# Altium footprint library pw.PcbLib: 210 footprints (part 1 of 14)
Each footprint in its own frame and in the unit in brackets; x right, y up, seen from the top. Pads: shape width x height; smd on the part's side, far side on the other; paste and mask are expansions set on the pad; w line width, h text height; cw(c..) or ccw(c..) is an arc to the next point about the centre after c.
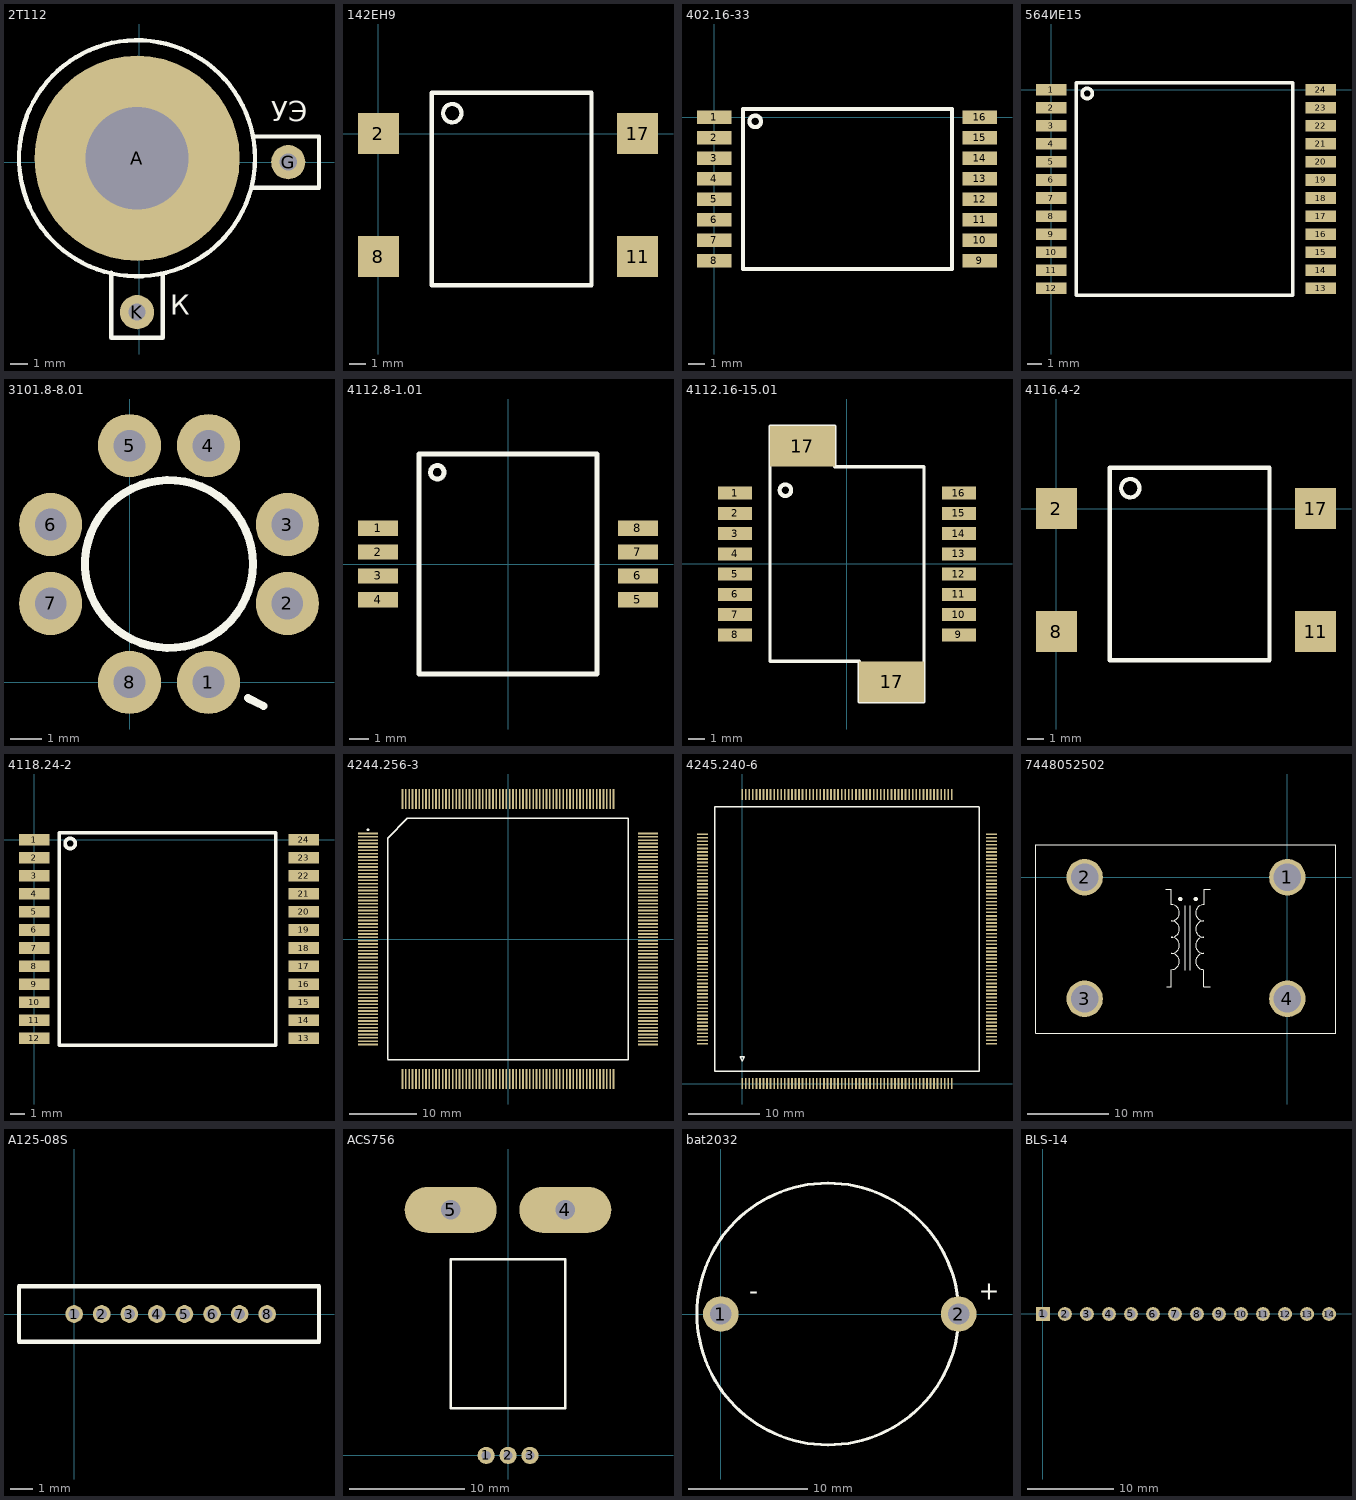
[diagram p0: the footprints below, top view; thin cyan lines are the x and y axes]

## 2T112 [mm]
pads (3):
  round 12 hole 6: A(-0.14,0.23)
  round 2 hole 1: G(8.7,0) K(-0.14,-8.77)
Top Overlay:
  circle w0.254: c-0.14,0.23 r6.9
  lines w0.254: -1.64,-6.47 -1.64,-10.27 ; 1.36,-6.57 1.36,-10.27 ; 6.7,-1.5 10.5,-1.5 10.5,1.5 6.8,1.5 ; -1.64,-10.27 1.36,-10.27 ; -1.64,-10.27 1.36,-10.27
  text "К" at 1.8,-9.3 h2
  text "УЭ" at 7.7,2 h2
3D body "User Library-DO-203AA_DO-4.STEP": height 20.3, standoff -11.5, extent -5.64,-6.028 5.36,6.488

## 142ЕН9 [mm]
pads (4):
  rect 2.5x2.5 smd: 2(0,0) 8(0,-7.5) 11(15.8,-7.5) 17(15.8,0)
Top Overlay:
  circle w0.254: c4.5,1.25 r0.559
  lines w0.254: 3.25,-9.25 3.25,2.5 13,2.5 13,-9.25 3.25,-9.25

## 402.16-33 [mm]
pads (16):
  rect 2.1x0.8 smd: 1(0,0) 2(0,-1.25) 3(0,-2.5) 4(0,-3.75) 5(0,-5) 6(0,-6.25) 7(0,-7.5) 8(0,-8.75) 9(16.2,-8.75) 10(16.2,-7.5) 11(16.2,-6.25) 12(16.2,-5) 13(16.2,-3.75) 14(16.2,-2.5) 15(16.2,-1.25) 16(16.2,0)
Top Overlay:
  circle w0.254: c2.5,-0.25 r0.354
  lines w0.254: 1.75,-9.25 14.5,-9.25 14.5,0.5 1.75,0.5 1.75,-9.25
3D body "User Library-402_16.STEP": height 2.51, standoff 0, extent 0.75,-10 15.25,1.5

## 564ИЕ15 [mm]
pads (24):
  rect 2.1x0.8 smd: 1(0,0) 2(0,-1.25) 3(0,-2.5) 4(0,-3.75) 5(0,-5) 6(0,-6.25) 7(0,-7.5) 8(0,-8.75) 9(0,-10) 10(0,-11.25) 11(0,-12.5) 12(0,-13.75) 13(18.7,-13.75) 14(18.7,-12.5) 15(18.7,-11.25) 16(18.7,-10) 17(18.7,-8.75) 18(18.7,-7.5) 19(18.7,-6.25) 20(18.7,-5) 21(18.7,-3.75) 22(18.7,-2.5) 23(18.7,-1.25) 24(18.7,0)
Top Overlay:
  circle w0.254: c2.5,-0.25 r0.354
  lines w0.254: 1.75,-14.25 1.75,0.5 16.75,0.5 16.75,-14.25 1.75,-14.25

## 3101.8-8.01 [mm] "544УД1, 521СА301"
pads (8):
  round 2 hole 1: 1(2.5,0) 2(5,2.5) 3(5,5) 4(2.5,7.5) 5(0,7.5) 6(-2.5,5) 7(-2.5,2.5) 8(0,0)
Top Overlay:
  circle w0.254: c1.25,3.75 r2.658
  lines w0.254: 3.75,-0.5 4.25,-0.75

## 4112.8-1.01 [mm]
height 2.5
pads (8):
  rect 2.1x0.8 smd: 1(-6.8,1.875) 2(-6.8,0.625) 3(-6.8,-0.625) 4(-6.8,-1.875) 5(6.8,-1.875) 6(6.8,-0.625) 7(6.8,0.625) 8(6.8,1.875)
Top Overlay:
  circle w0.254: c-3.7,4.8 r0.354
  lines w0.254: -4.65,-5.75 4.65,-5.75 4.65,-2.875 4.65,2.875 4.65,5.75 -4.65,5.75 -4.65,-5.75
3D body "User Library-4112_8-1_01.step": height 2.5, standoff 0, extent -7.15,-5.75 7.15,5.75

## 4112.16-15.01 [mm]
height 2.5
pads (18):
  rect 2.1x0.8 smd: 1(-6.9,4.375) 2(-6.9,3.125) 3(-6.9,1.875) 4(-6.9,0.625) 5(-6.9,-0.625) 6(-6.9,-1.875) 7(-6.9,-3.125) 8(-6.9,-4.375) 9(6.9,-4.375) 10(6.9,-3.125) 11(6.9,-1.875) 12(6.9,-0.625) 13(6.9,0.625) 14(6.9,1.875) 15(6.9,3.125) 16(6.9,4.375)
  rect 4x2.5 smd: 17(-2.75,7.25) 17(2.75,-7.25)
Top Overlay:
  circle w0.254: c-3.8,4.55 r0.354
  lines w0.2: -3.25,8.5 -4.75,8.5 ; 4.5,-8.5 4.75,-8.5 ; -4.75,8.5 -0.75,8.5 -0.75,6 4.75,6 4.75,-8.5 ; -4.75,8.5 -4.75,-6 0.75,-6 0.75,-8.5 4.75,-8.5
3D body "User Library-402_16.STEP": height 2.51, standoff 0, extent -7.25,-5.75 7.25,5.75

## 4116.4-2 [mm] "142ЕН9"
pads (4):
  rect 2.5x2.5 smd: 2(0,0) 8(0,-7.5) 11(15.8,-7.5) 17(15.8,0)
Top Overlay:
  circle w0.254: c4.5,1.25 r0.559
  lines w0.254: 3.25,-9.25 3.25,2.5 13,2.5 13,-9.25 3.25,-9.25
3D body "User Library-4116_4-2.STEP": height 3.2, standoff 0, extent 1,-16.25 15,8.75

## 4118.24-2 [mm]
pads (24):
  rect 2.1x0.8 smd: 1(0,0) 2(0,-1.25) 3(0,-2.5) 4(0,-3.75) 5(0,-5) 6(0,-6.25) 7(0,-7.5) 8(0,-8.75) 9(0,-10) 10(0,-11.25) 11(0,-12.5) 12(0,-13.75) 13(18.7,-13.75) 14(18.7,-12.5) 15(18.7,-11.25) 16(18.7,-10) 17(18.7,-8.75) 18(18.7,-7.5) 19(18.7,-6.25) 20(18.7,-5) 21(18.7,-3.75) 22(18.7,-2.5) 23(18.7,-1.25) 24(18.7,0)
Top Overlay:
  circle w0.254: c2.5,-0.25 r0.354
  lines w0.254: 1.75,-14.25 16.75,-14.25 16.75,0.5 1.75,0.5 1.75,-14.25
3D body "User Library-4118_24-1-1.STEP": height 3.21, standoff 0, extent 0,-14.46 18.5,0.95

## 4244.256-3 [mm]
pads (256):
  rect 3x0.25 smd: 1(-20.898,15.75) 2(-20.898,15.25) 3(-20.898,14.75) 4(-20.898,14.25) 5(-20.898,13.75) 6(-20.898,13.25) 7(-20.898,12.75) 8(-20.898,12.25) 9(-20.898,11.75) 10(-20.898,11.25) 11(-20.898,10.75) 12(-20.898,10.25) 13(-20.898,9.75) 14(-20.898,9.25) 15(-20.898,8.75) 16(-20.898,8.25) 17(-20.898,7.75) 18(-20.898,7.25) 19(-20.898,6.75) 20(-20.898,6.25) 21(-20.898,5.75) 22(-20.898,5.25) 23(-20.898,4.75) 24(-20.898,4.25) 25(-20.898,3.75) 26(-20.898,3.25) 27(-20.898,2.75) 28(-20.898,2.25) 29(-20.898,1.75) 30(-20.898,1.25) 31(-20.898,0.75) 32(-20.898,0.25) 33(-20.898,-0.25) 34(-20.898,-0.75) 35(-20.898,-1.25) 36(-20.898,-1.75) 37(-20.898,-2.25) 38(-20.898,-2.75) 39(-20.898,-3.25) 40(-20.898,-3.75) 41(-20.898,-4.25) 42(-20.898,-4.75) 43(-20.898,-5.25) 44(-20.898,-5.75) 45(-20.898,-6.25) 46(-20.898,-6.75) 47(-20.898,-7.25) 48(-20.898,-7.75) 49(-20.898,-8.25) 50(-20.898,-8.75) 51(-20.898,-9.25) 52(-20.898,-9.75) 53(-20.898,-10.25) 54(-20.898,-10.75) 55(-20.898,-11.25) 56(-20.898,-11.75) 57(-20.898,-12.25) 58(-20.898,-12.75) 59(-20.898,-13.25) 60(-20.898,-13.75) 61(-20.898,-14.25) 62(-20.898,-14.75) 63(-20.898,-15.25) 64(-20.898,-15.75) 129(20.898,-15.75) 130(20.898,-15.25) 131(20.898,-14.75) 132(20.898,-14.25) 133(20.898,-13.75) 134(20.898,-13.25) 135(20.898,-12.75) 136(20.898,-12.25) 137(20.898,-11.75) 138(20.898,-11.25) 139(20.898,-10.75) 140(20.898,-10.25) 141(20.898,-9.75) 142(20.898,-9.25) 143(20.898,-8.75) 144(20.898,-8.25) 145(20.898,-7.75) 146(20.898,-7.25) 147(20.898,-6.75) 148(20.898,-6.25) 149(20.898,-5.75) 150(20.898,-5.25) 151(20.898,-4.75) 152(20.898,-4.25) 153(20.898,-3.75) 154(20.898,-3.25) 155(20.898,-2.75) 156(20.898,-2.25) 157(20.898,-1.75) 158(20.898,-1.25) 159(20.898,-0.75) 160(20.898,-0.25) 161(20.898,0.25) 162(20.898,0.75) 163(20.898,1.25) 164(20.898,1.75) 165(20.898,2.25) 166(20.898,2.75) 167(20.898,3.25) 168(20.898,3.75) 169(20.898,4.25) 170(20.898,4.75) 171(20.898,5.25) 172(20.898,5.75) 173(20.898,6.25) 174(20.898,6.75) 175(20.898,7.25) 176(20.898,7.75) 177(20.898,8.25) 178(20.898,8.75) 179(20.898,9.25) 180(20.898,9.75) 181(20.898,10.25) 182(20.898,10.75) 183(20.898,11.25) 184(20.898,11.75) 185(20.898,12.25) 186(20.898,12.75) 187(20.898,13.25) 188(20.898,13.75) 189(20.898,14.25) 190(20.898,14.75) 191(20.898,15.25) 192(20.898,15.75)
  rect 0.25x3 smd: 65(-15.75,-20.898) 66(-15.25,-20.898) 67(-14.75,-20.898) 68(-14.25,-20.898) 69(-13.75,-20.898) 70(-13.25,-20.898) 71(-12.75,-20.898) 72(-12.25,-20.898) 73(-11.75,-20.898) 74(-11.25,-20.898) 75(-10.75,-20.898) 76(-10.25,-20.898) 77(-9.75,-20.898) 78(-9.25,-20.898) 79(-8.75,-20.898) 80(-8.25,-20.898) 81(-7.75,-20.898) 82(-7.25,-20.898) 83(-6.75,-20.898) 84(-6.25,-20.898) 85(-5.75,-20.898) 86(-5.25,-20.898) 87(-4.75,-20.898) 88(-4.25,-20.898) 89(-3.75,-20.898) 90(-3.25,-20.898) 91(-2.75,-20.898) 92(-2.25,-20.898) 93(-1.75,-20.898) 94(-1.25,-20.898) 95(-0.75,-20.898) 96(-0.25,-20.898) 97(0.25,-20.898) 98(0.75,-20.898) 99(1.25,-20.898) 100(1.75,-20.898) 101(2.25,-20.898) 102(2.75,-20.898) 103(3.25,-20.898) 104(3.75,-20.898) 105(4.25,-20.898) 106(4.75,-20.898) 107(5.25,-20.898) 108(5.75,-20.898) 109(6.25,-20.898) 110(6.75,-20.898) 111(7.25,-20.898) 112(7.75,-20.898) 113(8.25,-20.898) 114(8.75,-20.898) 115(9.25,-20.898) 116(9.75,-20.898) 117(10.25,-20.898) 118(10.75,-20.898) 119(11.25,-20.898) 120(11.75,-20.898) 121(12.25,-20.898) 122(12.75,-20.898) 123(13.25,-20.898) 124(13.75,-20.898) 125(14.25,-20.898) 126(14.75,-20.898) 127(15.25,-20.898) 128(15.75,-20.898) 193(15.75,20.898) 194(15.25,20.898) 195(14.75,20.898) 196(14.25,20.898) 197(13.75,20.898) 198(13.25,20.898) 199(12.75,20.898) 200(12.25,20.898) 201(11.75,20.898) 202(11.25,20.898) 203(10.75,20.898) 204(10.25,20.898) 205(9.75,20.898) 206(9.25,20.898) 207(8.75,20.898) 208(8.25,20.898) 209(7.75,20.898) 210(7.25,20.898) 211(6.75,20.898) 212(6.25,20.898) 213(5.75,20.898) 214(5.25,20.898) 215(4.75,20.898) 216(4.25,20.898) 217(3.75,20.898) 218(3.25,20.898) 219(2.75,20.898) 220(2.25,20.898) 221(1.75,20.898) 222(1.25,20.898) 223(0.75,20.898) 224(0.25,20.898) 225(-0.25,20.898) 226(-0.75,20.898) 227(-1.25,20.898) 228(-1.75,20.898) 229(-2.25,20.898) 230(-2.75,20.898) 231(-3.25,20.898) 232(-3.75,20.898) 233(-4.25,20.898) 234(-4.75,20.898) 235(-5.25,20.898) 236(-5.75,20.898) 237(-6.25,20.898) 238(-6.75,20.898) 239(-7.25,20.898) 240(-7.75,20.898) 241(-8.25,20.898) 242(-8.75,20.898) 243(-9.25,20.898) 244(-9.75,20.898) 245(-10.25,20.898) 246(-10.75,20.898) 247(-11.25,20.898) 248(-11.75,20.898) 249(-12.25,20.898) 250(-12.75,20.898) 251(-13.25,20.898) 252(-13.75,20.898) 253(-14.25,20.898) 254(-14.75,20.898) 255(-15.25,20.898) 256(-15.75,20.898)
Top Overlay:
  circle w0.254: c-20.896,16.307 r0.077
  lines w0.2: -17.991,-18 -16.05,-18 ; -17.991,-17.964 -17.991,15.076 -15.067,18 -5.135,18 16.05,18 17.988,18 17.988,14.851 ; -17.988,-17.964 -17.988,-16.05 ; -16.264,-18 14.621,-18 17.988,-18 ; 17.988,-17.998 17.988,-16.05 ; 17.988,-16.61 17.991,14.851
3D body "User Library-4244_256-3.step": height 3.26, standoff 0, extent -21.415,-21.397 21.385,21.403

## 4245.240-6 [mm]
pads (240):
  rect 0.25x1.524 smd: 1(0,0) 2(0.5,0) 3(1,0) 4(1.5,0) 5(2,0) 6(2.5,0) 7(3,0) 8(3.5,0) 9(4,0) 10(4.5,0) 11(5,0) 12(5.5,0) 13(6,0) 14(6.5,0) 15(7,0) 16(7.5,0) 17(8,0) 18(8.5,0) 19(9,0) 20(9.5,0) 21(10,0) 22(10.5,0) 23(11,0) 24(11.5,0) 25(12,0) 26(12.5,0) 27(13,0) 28(13.5,0) 29(14,0) 30(14.5,0) 31(15,0) 32(15.5,0) 33(16,0) 34(16.5,0) 35(17,0) 36(17.5,0) 37(18,0) 38(18.5,0) 39(19,0) 40(19.5,0) 41(20,0) 42(20.5,0) 43(21,0) 44(21.5,0) 45(22,0) 46(22.5,0) 47(23,0) 48(23.5,0) 49(24,0) 50(24.5,0) 51(25,0) 52(25.5,0) 53(26,0) 54(26.5,0) 55(27,0) 56(27.5,0) 57(28,0) 58(28.5,0) 59(29,0) 60(29.5,0) 121(29.5,40.7) 122(29,40.7) 123(28.5,40.7) 124(28,40.7) 125(27.5,40.7) 126(27,40.7) 127(26.5,40.7) 128(26,40.7) 129(25.5,40.7) 130(25,40.7) 131(24.5,40.7) 132(24,40.7) 133(23.5,40.7) 134(23,40.7) 135(22.5,40.7) 136(22,40.7) 137(21.5,40.7) 138(21,40.7) 139(20.5,40.7) 140(20,40.7) 141(19.5,40.7) 142(19,40.7) 143(18.5,40.7) 144(18,40.7) 145(17.5,40.7) 146(17,40.7) 147(16.5,40.7) 148(16,40.7) 149(15.5,40.7) 150(15,40.7) 151(14.5,40.7) 152(14,40.7) 153(13.5,40.7) 154(13,40.7) 155(12.5,40.7) 156(12,40.7) 157(11.5,40.7) 158(11,40.7) 159(10.5,40.7) 160(10,40.7) 161(9.5,40.7) 162(9,40.7) 163(8.5,40.7) 164(8,40.7) 165(7.5,40.7) 166(7,40.7) 167(6.5,40.7) 168(6,40.7) 169(5.5,40.7) 170(5,40.7) 171(4.5,40.7) 172(4,40.7) 173(3.5,40.7) 174(3,40.7) 175(2.5,40.7) 176(2,40.7) 177(1.5,40.7) 178(1,40.7) 179(0.5,40.7) 180(0,40.7)
  rect 1.524x0.25 smd: 61(35.1,5.6) 62(35.1,6.1) 63(35.1,6.6) 64(35.1,7.1) 65(35.1,7.6) 66(35.1,8.1) 67(35.1,8.6) 68(35.1,9.1) 69(35.1,9.6) 70(35.1,10.1) 71(35.1,10.6) 72(35.1,11.1) 73(35.1,11.6) 74(35.1,12.1) 75(35.1,12.6) 76(35.1,13.1) 77(35.1,13.6) 78(35.1,14.1) 79(35.1,14.6) 80(35.1,15.1) 81(35.1,15.6) 82(35.1,16.1) 83(35.1,16.6) 84(35.1,17.1) 85(35.1,17.6) 86(35.1,18.1) 87(35.1,18.6) 88(35.1,19.1) 89(35.1,19.6) 90(35.1,20.1) 91(35.1,20.6) 92(35.1,21.1) 93(35.1,21.6) 94(35.1,22.1) 95(35.1,22.6) 96(35.1,23.1) 97(35.1,23.6) 98(35.1,24.1) 99(35.1,24.6) 100(35.1,25.1) 101(35.1,25.6) 102(35.1,26.1) 103(35.1,26.6) 104(35.1,27.1) 105(35.1,27.6) 106(35.1,28.1) 107(35.1,28.6) 108(35.1,29.1) 109(35.1,29.6) 110(35.1,30.1) 111(35.1,30.6) 112(35.1,31.1) 113(35.1,31.6) 114(35.1,32.1) 115(35.1,32.6) 116(35.1,33.1) 117(35.1,33.6) 118(35.1,34.1) 119(35.1,34.6) 120(35.1,35.1) 181(-5.6,35.1) 182(-5.6,34.6) 183(-5.6,34.1) 184(-5.6,33.6) 185(-5.6,33.1) 186(-5.6,32.6) 187(-5.6,32.1) 188(-5.6,31.6) 189(-5.6,31.1) 190(-5.6,30.6) 191(-5.6,30.1) 192(-5.6,29.6) 193(-5.6,29.1) 194(-5.6,28.6) 195(-5.6,28.1) 196(-5.6,27.6) 197(-5.6,27.1) 198(-5.6,26.6) 199(-5.6,26.1) 200(-5.6,25.6) 201(-5.6,25.1) 202(-5.6,24.6) 203(-5.6,24.1) 204(-5.6,23.6) 205(-5.6,23.1) 206(-5.6,22.6) 207(-5.6,22.1) 208(-5.6,21.6) 209(-5.6,21.1) 210(-5.6,20.6) 211(-5.6,20.1) 212(-5.6,19.6) 213(-5.6,19.1) 214(-5.6,18.6) 215(-5.6,18.1) 216(-5.6,17.6) 217(-5.6,17.1) 218(-5.6,16.6) 219(-5.6,16.1) 220(-5.6,15.6) 221(-5.6,15.1) 222(-5.6,14.6) 223(-5.6,14.1) 224(-5.6,13.6) 225(-5.6,13.1) 226(-5.6,12.6) 227(-5.6,12.1) 228(-5.6,11.6) 229(-5.6,11.1) 230(-5.6,10.6) 231(-5.6,10.1) 232(-5.6,9.6) 233(-5.6,9.1) 234(-5.6,8.6) 235(-5.6,8.1) 236(-5.6,7.6) 237(-5.6,7.1) 238(-5.6,6.6) 239(-5.6,6.1) 240(-5.6,5.6)
Top Overlay:
  lines w0.2: 33.3,38.95 -3.875,38.95 -3.875,1.75 33.35,1.75 33.35,38.95 ; -0.275,3.8 0.3,3.8 0,3.15 -0.275,3.8
3D body "User Library-4245_240-6.STEP": height 4.31, standoff 0, extent -5.85,-0.25 35.35,40.95

## 7448052502 [mm] "синфазный дроссель"
pads (4):
  round 4.5 hole 3.4: 1(0,0) 2(-25,0) 3(-25,-15) 4(0,-15)
Top Overlay:
  circle w0.254: c-13.2,-2.7 r0.141
  circle w0.254: c-11.3,-2.7 r0.141
  lines w0.125: -15,-1.5 -14.3,-1.5 -14.3,-3.4 cw(c-14.3,-4.4) -14.3,-5.4 cw(c-14.3,-6.4) -14.3,-7.4 cw(c-14.3,-8.4) -14.3,-9.4 cw(c-14.3,-10.4) -14.3,-11.4 -14.3,-13.5 -14.9,-13.5 ; -12.6,-11.5 -12.6,-3.5 ; -12,-11.5 -12,-3.5 ; -9.5,-13.5 -10.3,-13.5 -10.3,-11.4 cw(c-10.3,-10.4) -10.3,-9.4 cw(c-10.3,-8.4) -10.3,-7.4 cw(c-10.3,-6.4) -10.3,-5.4 cw(c-10.3,-4.4) -10.3,-3.4 -10.3,-1.5 -9.5,-1.5 ; -31,-19.25 6,-19.25 6,4 -31,4 -31,-19.25
3D body "SW3dPS-choke1.STEP": height 24.7, standoff -7.21, extent -25.204,-13.438 0.204,-1.5

## A125-08S [mm]
pads (8):
  round 0.8 hole 0.5: 1(0,0) 2(1.25,0) 3(2.5,0) 4(3.75,0) 5(5,0) 6(6.25,0) 7(7.5,0) 8(8.75,0)
Top Overlay:
  lines w0.2: -2.5,-1.25 11.1,-1.25 11.1,1.25 -2.5,1.25 -2.5,-1.25
3D body "User Library-53047-0810.STEP": height 4, standoff -2.5, extent -1.5,-2.25 10.25,1.25

## ACS756 [mm]
pads (5):
  round 1.5 hole 0.8: 1(-1.9,0) 2(0.01,0) 3(1.92,0)
  oval 8x4 hole 1.7 square: 4(5,21.4) 5(-5,21.4)
Top Overlay:
  lines w0.2: -5,4.1 -5,17.1 5,17.1 5,4.1 -5,4.1
3D body "SW3dPS-ACS754SCB-200-PFF.STEP": height 7, standoff -3.51, extent -7,-0.7 7,22.122

## bat2032 [mm]
pads (2):
  round 3 hole 1.8: 1(0,0) 2(20,0)
Top Overlay:
  circle w0.254: c9,0 r11.01
  text "+" at 21.7,1.2 h1.52
  text "-" at 2.4,1.2 h1.52
3D body "User Library-CR2032_HOR_HOLD.STEP": height 8.5, standoff -4, extent -2.45,-11.1 22.05,10.9

## BLS-14 [mm]
pads (14):
  rect 1.6x1.6 hole 1: 1(0,0)
  round 1.6 hole 1: 2(2.54,0) 3(5.08,0) 4(7.62,0) 5(10.16,0) 6(12.7,0) 7(15.24,0) 8(17.78,0) 9(20.32,0) 10(22.86,0) 11(25.4,0) 12(27.94,0) 13(30.48,0) 14(33.02,0)